# Altium footprint library PCB_Wearing_sensor.PcbLib: 55 footprints (part 4 of 4)
Each footprint in its own frame and in the unit in brackets; x right, y up, seen from the top. Pads: shape width x height; smd on the part's side, far side on the other; paste and mask are expansions set on the pad; w line width, h text height; cw(c..) or ccw(c..) is an arc to the next point about the centre after c.
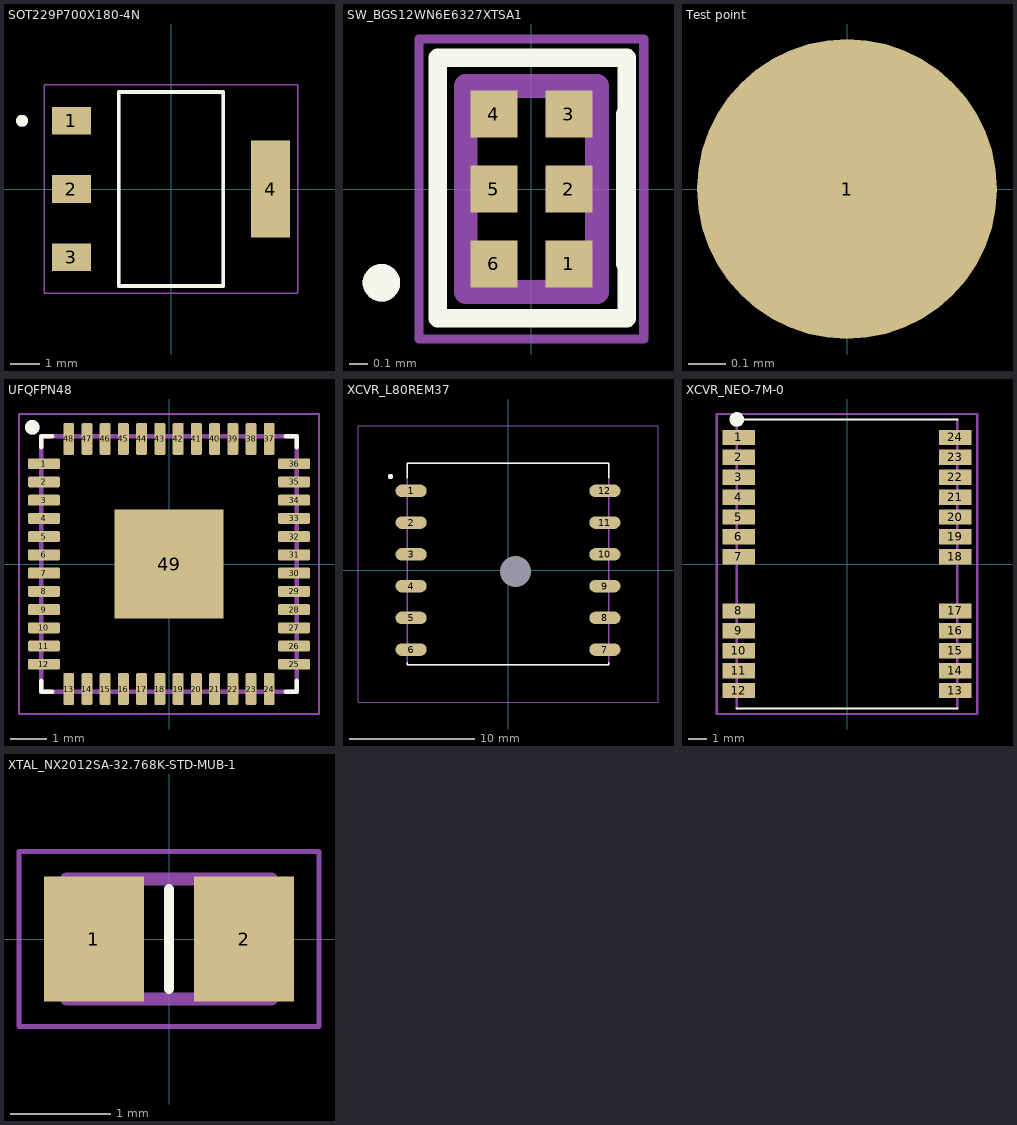
[diagram p3: the footprints below, top view; thin cyan lines are the x and y axes]

## SOT229P700X180-4N [mm]
height 1.8
pads (4):
  rect 1.31x0.93 smd: 1(-3.345,2.29) 2(-3.345,0) 3(-3.345,-2.29)
  rect 1.31x3.24 smd: 4(3.345,0)
Top Overlay:
  circle w0.2: c-5,2.29 r0.1
  lines w0.127: -1.753,-3.253 -1.753,3.253 1.753,3.253 1.753,-3.253 -1.753,-3.253
Top Assy:
  text ".Designator" at -3.432,-0.345 h1.52
Top Courtyard (Mech8):
  lines w0.05: -4.25,-3.502 -4.25,3.502 4.25,3.502 4.25,-3.502 -4.25,-3.502
Mechanical 13:
  circle w0.2: c-5,2.29 r0.1
  lines w0.127: -1.753,-3.253 -1.753,3.253 1.753,3.253 1.753,-3.253 -1.753,-3.253
3D body "step_temp.STEP": height 1.8, standoff 0, extent -3.499,-3.251 3.499,3.251

## SW_BGS12WN6E6327XTSA1 [mm]
pads (6):
  rect 0.25x0.25 smd paste-1 mask+0: 1(0.2,-0.4) 2(0.2,0) 3(0.2,0.4) 4(-0.2,0.4) 5(-0.2,0) 6(-0.2,-0.4)
Top Overlay:
  circle w0.1: c-0.8,-0.5 r0.05
  lines w0.1: -0.5,-0.4 -0.5,0.4 ; 0.5,-0.4 0.5,0.4 ; -0.5,-0.69 0.509,-0.69 0.509,0.7 -0.5,0.7 -0.5,-0.69
Top Paste:
  circle w0.125: c0.2,-0.4 r0.062
  circle w0.125: c0.2,0 r0.062
  circle w0.125: c0.2,0.4 r0.062
  circle w0.125: c-0.2,0.4 r0.062
  circle w0.125: c-0.2,-0.4 r0.062
  circle w0.125: c-0.2,0 r0.062
Top Solder:
  region: 0.35,-0.55 0.05,-0.55 0.05,-0.25 0.35,-0.25
  region: -0.05,-0.55 -0.35,-0.55 -0.35,-0.25 -0.05,-0.25
  region: -0.05,0.25 -0.35,0.25 -0.35,0.55 -0.05,0.55
  region: 0.35,0.25 0.05,0.25 0.05,0.55 0.35,0.55
  region: 0.35,-0.15 0.05,-0.15 0.05,0.15 0.35,0.15
  region: -0.05,-0.15 -0.35,-0.15 -0.35,0.15 -0.05,0.15
Top Component Body:
  lines w0.127: -0.35,-0.55 -0.35,0.55 0.35,0.55 0.35,-0.55 -0.35,-0.55
Top Assy:
  text ".Designator" at -2.253,-0.226 h1
Top Courtyard (Mech8):
  lines w0.05: -0.6,-0.8 -0.6,0.8 0.6,0.8 0.6,-0.8 -0.6,-0.8
Mechanical 13:
  circle w0.1: c-0.8,-0.5 r0.05

## Test point [mm]
pads (1):
  round 0.8 smd: 1(0,0)

## UFQFPN48 [mm]
pads (49):
  rrect25% 0.87x0.3 smd: 1(-3.43,2.75) 2(-3.43,2.25) 3(-3.43,1.75) 4(-3.43,1.25) 5(-3.43,0.75) 6(-3.43,0.25) 7(-3.43,-0.25) 8(-3.43,-0.75) 9(-3.43,-1.25) 10(-3.43,-1.75) 11(-3.43,-2.25) 12(-3.43,-2.75) 25(3.43,-2.75) 26(3.43,-2.25) 27(3.43,-1.75) 28(3.43,-1.25) 29(3.43,-0.75) 30(3.43,-0.25) 31(3.43,0.25) 32(3.43,0.75) 33(3.43,1.25) 34(3.43,1.75) 35(3.43,2.25) 36(3.43,2.75)
  rrect25% 0.3x0.87 smd: 13(-2.75,-3.43) 14(-2.25,-3.43) 15(-1.75,-3.43) 16(-1.25,-3.43) 17(-0.75,-3.43) 18(-0.25,-3.43) 19(0.25,-3.43) 20(0.75,-3.43) 21(1.25,-3.43) 22(1.75,-3.43) 23(2.25,-3.43) 24(2.75,-3.43) 37(2.75,3.43) 38(2.25,3.43) 39(1.75,3.43) 40(1.25,3.43) 41(0.75,3.43) 42(0.25,3.43) 43(-0.25,3.43) 44(-0.75,3.43) 45(-1.25,3.43) 46(-1.75,3.43) 47(-2.25,3.43) 48(-2.75,3.43)
  rect 3x3 smd paste-4: 49(0,0)
Top Overlay:
  circle w0.2: c-3.75,3.75 r0.1
  lines w0.127: -3.5,-3.205 -3.5,-3.5 -3.205,-3.5 ; -3.5,3.205 -3.5,3.5 -3.205,3.5 ; 3.205,-3.5 3.5,-3.5 3.5,-3.205 ; 3.205,3.5 3.5,3.5 3.5,3.205
Top Paste:
  region: 0.89,-0.89 -0.89,-0.89 -0.89,0.89 0.89,0.89
Top Assy:
  text ".Designator" at -3.432,-0.345 h1.52
Top Courtyard (Mech8):
  lines w0.05: -4.115,-4.115 4.115,-4.115 4.115,4.115 -4.115,4.115 -4.115,-4.115
Mechanical 13:
  circle w0.2: c-3.75,3.75 r0.1
  lines w0.127: -3.5,-3.5 -3.5,3.5 3.5,3.5 3.5,-3.5 -3.5,-3.5
3D body "STM32WB55CCU6.STEP": height 0.6, standoff 0, extent -3.5,-3.5 3.5,3.5

## XCVR_L80REM37 [mm]
pads (13):
  oval 2.5x1 smd paste-2: 1(-7.75,6.35) 2(-7.75,3.81) 3(-7.75,1.27) 4(-7.75,-1.27) 5(-7.75,-3.81) 6(-7.75,-6.35) 7(7.75,-6.35) 8(7.75,-3.81) 9(7.75,-1.27) 10(7.75,1.27) 11(7.75,3.81) 12(7.75,6.35)
  round 0 hole 2.5 unplated: 13(0.6,-0.1)
Top Overlay:
  circle w0.2: c-9.4,7.5 r0.1
  lines w0.127: -8.075,-7.4 -8.075,-7.575 8.075,-7.575 8.075,-7.4 ; -8.075,7.4 -8.075,8.575 8.075,8.575 8.075,7.4
Top Paste:
  drawing of 12 lines, arcs and shapes, not listed
Top Component Body:
  lines w0.127: -8.075,-7.575 8.075,-7.575 8.075,8.575 -8.075,8.575 -8.075,-7.575
Top Assy:
  text ".Designator" at -3.432,-0.345 h1.52
Top Courtyard (Mech8):
  lines w0.05: -12,-10.575 -12,11.575 12,11.575 12,-10.575 -12,-10.575
Mechanical 13:
  circle w0.2: c-9.4,7.5 r0.1
3D body "L80REM37.STEP": height 6.95, standoff 0, extent -7.975,-7.5 8.025,8.5

## XCVR_NEO-7M-0 [mm]
pads (24):
  rect 1.8x0.85 smd: 1(-6,7) 2(-6,5.9) 3(-6,4.8) 4(-6,3.7) 5(-6,2.6) 6(-6,1.5) 7(-6,0.4) 8(-6,-2.6) 9(-6,-3.7) 10(-6,-4.8) 11(-6,-5.9) 12(-6,-7) 13(6,-7) 14(6,-5.9) 15(6,-4.8) 16(6,-3.7) 17(6,-2.6) 18(6,0.4) 19(6,1.5) 20(6,2.6) 21(6,3.7) 22(6,4.8) 23(6,5.9) 24(6,7)
Top Overlay:
  circle w0.406: c-6.1,8 r0.2
  lines w0.127: -6.1,-8 6.1,-8 ; -6.1,8 6.1,8
Top Component Body:
  lines w0.127: -6.1,-8 -6.1,8 ; 6.1,-8 6.1,8
Top Assy:
  text ".Designator" at -2.253,-0.226 h1
Top Courtyard (Mech8):
  lines w0.127: -7.2,-8.3 7.2,-8.3 7.2,8.3 -7.2,8.3 -7.2,-8.3
3D body "NEO-7M-0.STEP": height 2.6, standoff 0, extent -6.1,-8 6.1,8

## XTAL_NX2012SA-32.768K-STD-MUB-1 [mm]
pads (2):
  rect 1x1.25 smd: 1(-0.75,0) 2(0.75,0)
Top Overlay:
  lines w0.1: 0,-0.5 0,0.5
Top Component Body:
  lines w0.127: -1.025,-0.6 -1.025,0.6 1.025,0.6 1.025,-0.6 -1.025,-0.6
Top Assy:
  text ".Designator" at -3.432,-0.345 h1.52
Top Courtyard (Mech8):
  lines w0.05: -1.5,-0.875 -1.5,0.875 1.5,0.875 1.5,-0.875 -1.5,-0.875
3D body "step_temp.STEP": height 0.6, standoff 0, extent -1.025,-0.6 1.025,0.6